# Altium footprint library SMDLibrary.PcbLib: 306 footprints (part 17 of 20)
Each footprint in its own frame and in the unit in brackets; x right, y up, seen from the top. Pads: shape width x height; smd on the part's side, far side on the other; paste and mask are expansions set on the pad; w line width, h text height; cw(c..) or ccw(c..) is an arc to the next point about the centre after c.
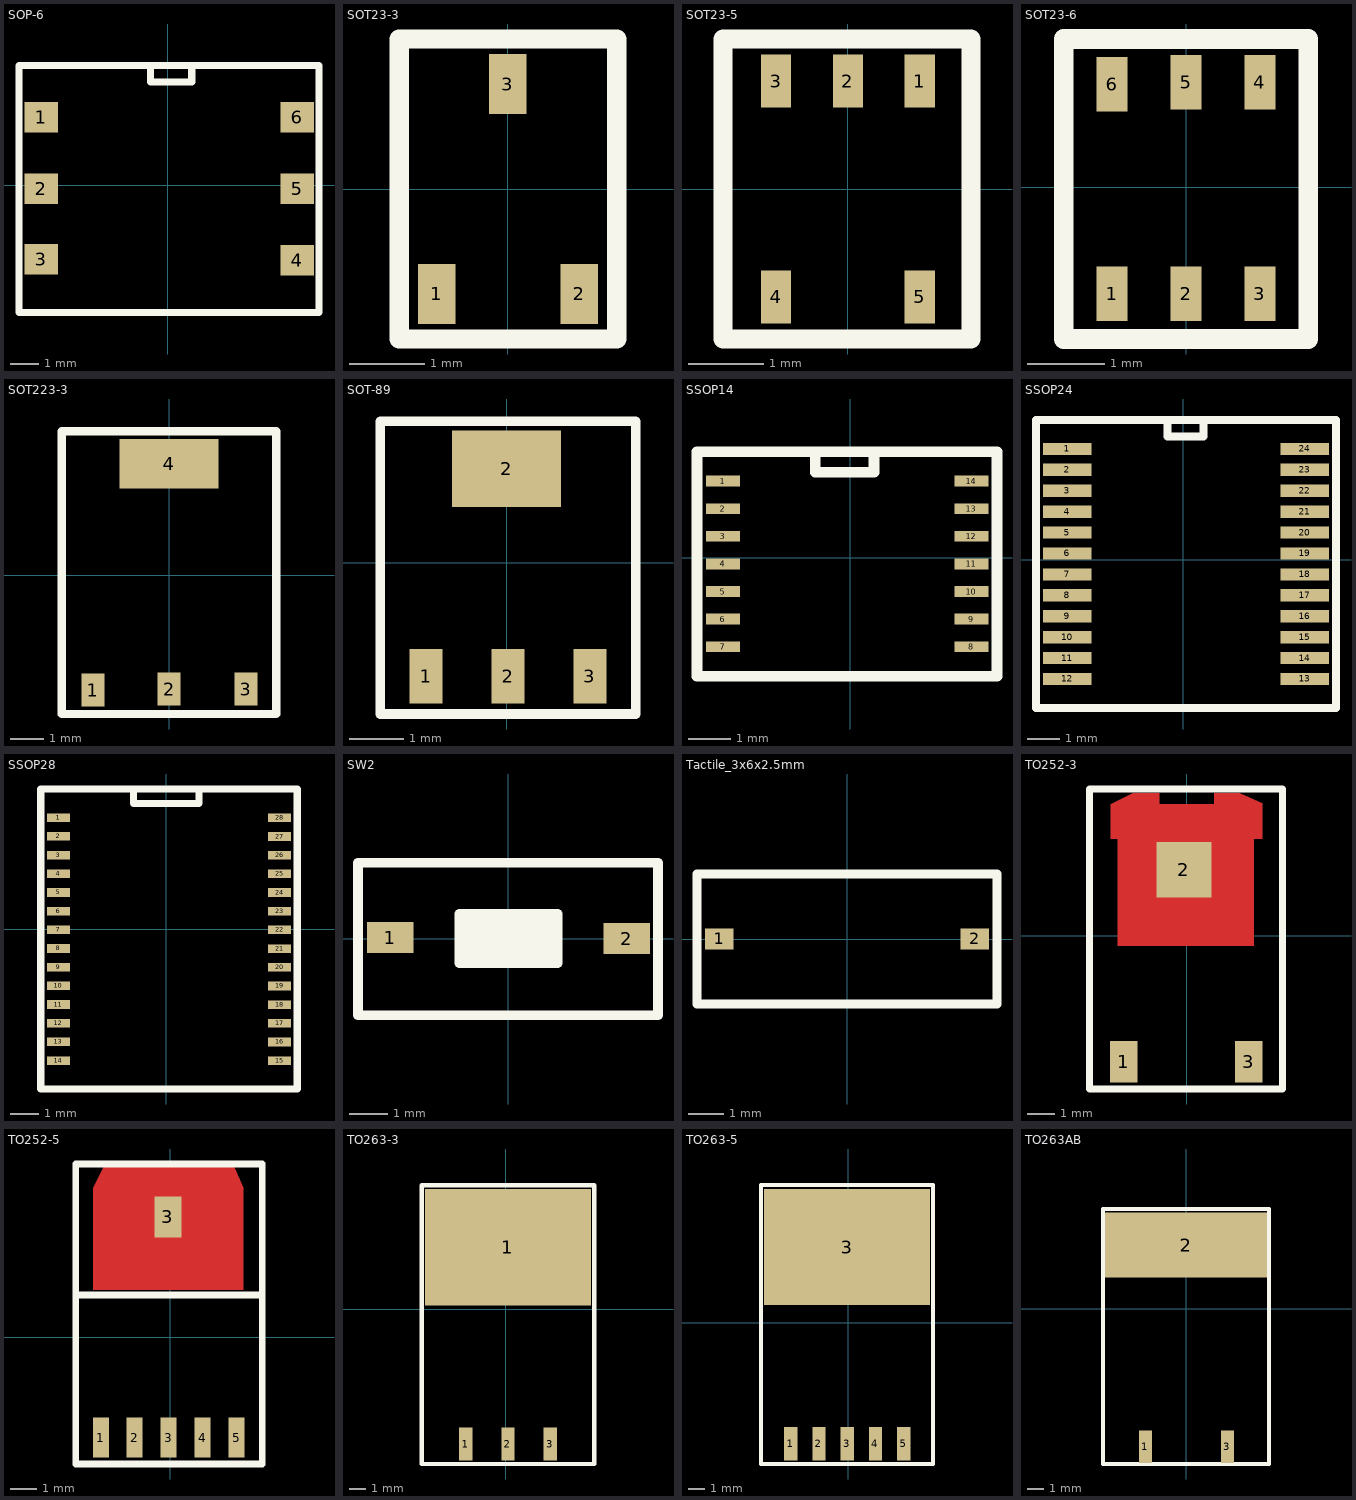
[diagram p16: the footprints below, top view; thin cyan lines are the x and y axes]

## SOP-6 [mm]
pads (6):
  rect 1.2x1.09 smd: 1(-4.52,2.418) 2(-4.52,-0.132) 3(-4.52,-2.657) 4(4.63,-2.682) 5(4.63,-0.132) 6(4.63,2.418)
Top Overlay:
  lines w0.254: -0.61,4.242 -0.61,3.683 0.864,3.683 0.864,4.242 ; -5.309,-4.547 -5.309,4.267 5.41,4.267 5.41,-4.547 -5.309,-4.547
3D body "User Library-SOP-6.STEP": height 4, standoff -0.08, extent -4.52,-4.387 4.645,4.123

## SOT23-3 [mm]
pads (3):
  rect 0.5x0.8 smd: 1(-0.95,-1.4) 2(0.95,-1.4) 3(0,1.4)
Top Overlay:
  lines w0.254: -1.45,-2 1.45,-2 1.45,2 -1.45,2 -1.45,-2
3D body "User Library-SOT23-3.STEP": height 1.3, standoff 0, extent -1.45,-1.4 1.45,1.4

## SOT23-5 [mm]
pads (5):
  rect 0.4x0.7 smd: 1(0.95,1.424) 2(0,1.424) 3(-0.95,1.424) 4(-0.95,-1.425) 5(0.95,-1.425)
Top Overlay:
  lines w0.254: -1.651,-1.981 1.626,-1.981 1.626,1.981 -1.651,1.981 -1.651,-1.981
3D body "User Library-SOT-23-5.STEP": height 1.45, standoff -0.01, extent -1.5,-1.5 1.5,1.5

## SOT23-6 [mm]
pads (6):
  rect 0.4x0.7 smd: 1(-0.95,-1.375) 2(0,-1.375) 3(0.95,-1.375) 4(0.95,1.35) 5(0,1.35) 6(-0.95,1.325)
Top Overlay:
  lines w0.254: -1.575,-1.956 -1.575,1.905 1.575,1.905 1.575,-1.956 -1.575,-1.956
3D body "User Library-SOT23-6-2.STEP": height 1.45, standoff 0, extent -1.45,-1.4 1.45,1.4

## SOT223-3 [mm]
pads (4):
  rect 0.7x1 smd: 1(-2.3,-3.475) 2(0,-3.45) 3(2.325,-3.45)
  rect 3x1.5 smd: 4(0,3.375)
Top Overlay:
  lines w0.254: -3.25,-4.2 -3.25,4.35 3.25,4.35 3.25,-4.2 -3.25,-4.2
3D body "User Library-SOT223-3.STEP": height 1.7, standoff 0, extent -3.25,-3.5 3.25,3.5

## SOT-89 [mm]
pads (4):
  rect 0.6x1 smd: 1(-1.475,-2.075) 2(0.027,-2.079) 3(1.525,-2.075)
  rect 2x1.4 smd: 2(0,1.725)
Top Overlay:
  lines w0.178: -2.311,-2.769 2.362,-2.769 2.362,2.591 -2.311,2.591 -2.311,-2.769
3D body "User Library-SOT-89-1.step": height 1.51, standoff 0, extent -2.223,-2.304 2.277,1.996

## SSOP14 [mm]
pads (14):
  rect 0.8x0.254 smd: 1(-3,1.8) 2(-3,1.15) 3(-3,0.5) 4(-3,-0.15) 5(-3,-0.8) 6(-3,-1.45) 7(-3,-2.1) 8(2.85,-2.1) 9(2.85,-1.45) 10(2.85,-0.8) 11(2.85,-0.15) 12(2.85,0.5) 13(2.85,1.15) 14(2.85,1.8)
Top Overlay:
  lines w0.254: -0.826,2.464 -0.826,2.007 0.559,2.007 0.559,2.464 ; -3.607,-2.794 3.454,-2.794 3.454,2.489 -3.607,2.489 -3.607,-2.794
3D body "User Library-SSOP14-P065.STEP": height 1.73, standoff -0.08, extent -3.075,-2.65 2.925,2.35

## SSOP24 [mm]
pads (24):
  rect 1.5x0.38 smd: 1(-3.6,3.45) 2(-3.6,2.8) 3(-3.6,2.15) 4(-3.6,1.5) 5(-3.6,0.85) 6(-3.6,0.2) 7(-3.6,-0.45) 8(-3.6,-1.1) 9(-3.6,-1.75) 10(-3.6,-2.4) 11(-3.6,-3.05) 12(-3.6,-3.7) 13(3.775,-3.7) 14(3.775,-3.05) 15(3.775,-2.4) 16(3.775,-1.75) 17(3.775,-1.1) 18(3.775,-0.45) 19(3.775,0.2) 20(3.775,0.85) 21(3.775,1.5) 22(3.775,2.15) 23(3.775,2.8) 24(3.775,3.45)
Top Overlay:
  lines w0.254: -0.483,4.343 -0.483,3.835 0.635,3.835 0.635,4.293 ; -4.572,-4.597 -4.572,4.343 4.75,4.343 4.75,-4.597 -4.572,-4.597
3D body "User Library-SSOP 24 PIN_.STEP": height 1.93, standoff -0.06, extent -3.85,-4.43 4.05,4.2

## SSOP28 [mm]
pads (28):
  rect 0.8x0.3 smd: 1(-3.76,3.877) 2(-3.76,3.227) 3(-3.76,2.577) 4(-3.76,1.927) 5(-3.76,1.277) 6(-3.76,0.627) 7(-3.76,-0.023) 8(-3.76,-0.673) 9(-3.76,-1.323) 10(-3.76,-1.973) 11(-3.76,-2.623) 12(-3.76,-3.273) 13(-3.76,-3.923) 14(-3.76,-4.573) 15(3.937,-4.577) 16(3.937,-3.926) 17(3.937,-3.277) 18(3.937,-2.626) 19(3.937,-1.977) 20(3.937,-1.326) 21(3.937,-0.677) 22(3.937,-0.026) 23(3.937,0.623) 24(3.937,1.274) 25(3.937,1.923) 26(3.937,2.574) 27(3.937,3.223) 28(3.937,3.873)
Top Overlay:
  lines w0.254: -1.143,4.826 -1.143,4.369 1.13,4.369 1.13,4.864 ; -4.369,-5.563 -4.369,4.877 4.547,4.877 4.547,-5.563 3.492,-5.563 -4.369,-5.563
3D body "User Library-SSOP-28-3.STEP": height 1.9, standoff 0, extent -3.775,-5.425 4.025,4.775

## SW2 [mm]
pads (2):
  rect 1.2x0.8 smd: 1(-3.048,0.025) 2(3.048,0)
Top Overlay:
  rectangle: -1.27,-0.635 1.27,0.635
  lines w0.254: -3.886,-1.981 -3.886,1.956 3.861,1.956 3.861,-1.981 -3.886,-1.981 ; -1.27,-0.635 1.27,-0.635 1.27,0.635 -1.27,0.635 -1.27,-0.635
3D body "User Library-Button-SMD.step": height 2.5, standoff 0, extent -3.05,-1.85 3.05,1.85

## Tactile_3x6x2.5mm [mm]
pads (2):
  rect 0.8x0.6 smd: 1(-3.6,0) 2(3.6,0)
Top Overlay:
  lines w0.254: -4.225,-1.825 4.225,-1.825 4.225,1.825 -4.225,1.825 -4.225,-1.825
3D body "Tactile_SMD_3x6x2.5mm.SLDPRT": height 2.51, standoff 0, extent -4.026,-1.829 4.026,1.829

## TO252-3 [mm]
pads (3):
  rect 1x1.5 smd: 1(-2.284,-4.568) 3(2.262,-4.568)
  rect 2x2 smd: 2(-0.1,2.4)
Top Layer:
  region: -1.954,5.186 -2.767,4.779 -2.767,3.535 -2.513,3.535 -2.513,-0.351 2.44,-0.351 2.44,3.535 2.745,3.535 2.745,4.814 1.932,5.186 0.992,5.186 0.992,4.779 -0.989,4.779 -0.989,5.186
Top Overlay:
  lines w0.254: -3.531,-5.563 -3.531,5.334 3.48,5.334 3.48,-5.563 -3.531,-5.563
3D body "User Library-DPAK_TO-252AA.STEP": height 2.37, standoff -0.03, extent -3.391,-4.925 3.343,5.175

## TO252-5 [mil]
pads (6):
  rect 23.62x59.06 smd: 1(-102,-148) 2(-52,-148) 3(-2,-148) 4(48,-148) 5(98,-148)
  rect 39.37x60 smd: 3(-3,177)
Top Layer:
  region: -98,250 -113,220 -113,70 108,70 108,220 95,250
Top Overlay:
  lines w10: -132.88,62 131,62 ; -139,-187 -139,255 136,255 136,-187 -139,-187
3D body "User Library-DPAK-5.STEP": height 94.49, standoff -0.04, extent -133.88,-156.18 129.9,249.3

## TO263-3 [mm]
pads (4):
  rect 0.8x2 smd: 1(-2.418,-8.095) 2(0.122,-8.095) 3(2.662,-8.095)
  rect 10x7 smd: 1(0.122,3.741)
Top Overlay:
  lines w0.254: -5.055,-9.296 5.309,-9.296 5.309,7.468 -5.055,7.468 -5.055,-6.262 -5.055,-9.296
3D body "SW3dPS-TO263-3.STEP": height 4.78, standoff -0.02, extent -4.878,-8.742 5.122,6.928

## TO263-5 [mm]
pads (6):
  rect 0.8x2 smd: 1(-3.454,-7.286) 2(-1.754,-7.286) 3(-0.054,-7.286) 4(1.646,-7.286) 5(3.346,-7.286)
  rect 10x7 smd: 3(-0.054,4.55)
Top Overlay:
  lines w0.254: -5.232,-8.509 5.105,-8.509 5.105,8.28 -5.232,8.28 -5.232,-5.454 -5.232,-8.509
3D body "SW3dPS-TO263-5.STEP": height 4.79, standoff -0.01, extent -5.054,-7.933 4.946,7.737

## TO263AB [mm]
pads (3):
  rect 0.8x2 smd: 1(-2.525,-8.475) 3(2.525,-8.475)
  rect 10x4 smd: 2(-0.025,3.925)
Top Overlay:
  lines w0.254: 5.075,-9.55 5.075,-9.55 ; 5.075,-9.55 -5.125,-9.55 -5.125,6.147 5.075,6.147 5.075,-9.55
3D body "SW3dPS-DPAK.STEP": height 4.98, standoff -0.03, extent -5.08,-9.416 5.08,5.848